# Altium footprint library Miscellaneous THD.PcbLib: 216 footprints (part 8 of 15)
Each footprint in its own frame and in the unit in brackets; x right, y up, seen from the top. Pads: shape width x height; smd on the part's side, far side on the other; paste and mask are expansions set on the pad; w line width, h text height; cw(c..) or ccw(c..) is an arc to the next point about the centre after c.
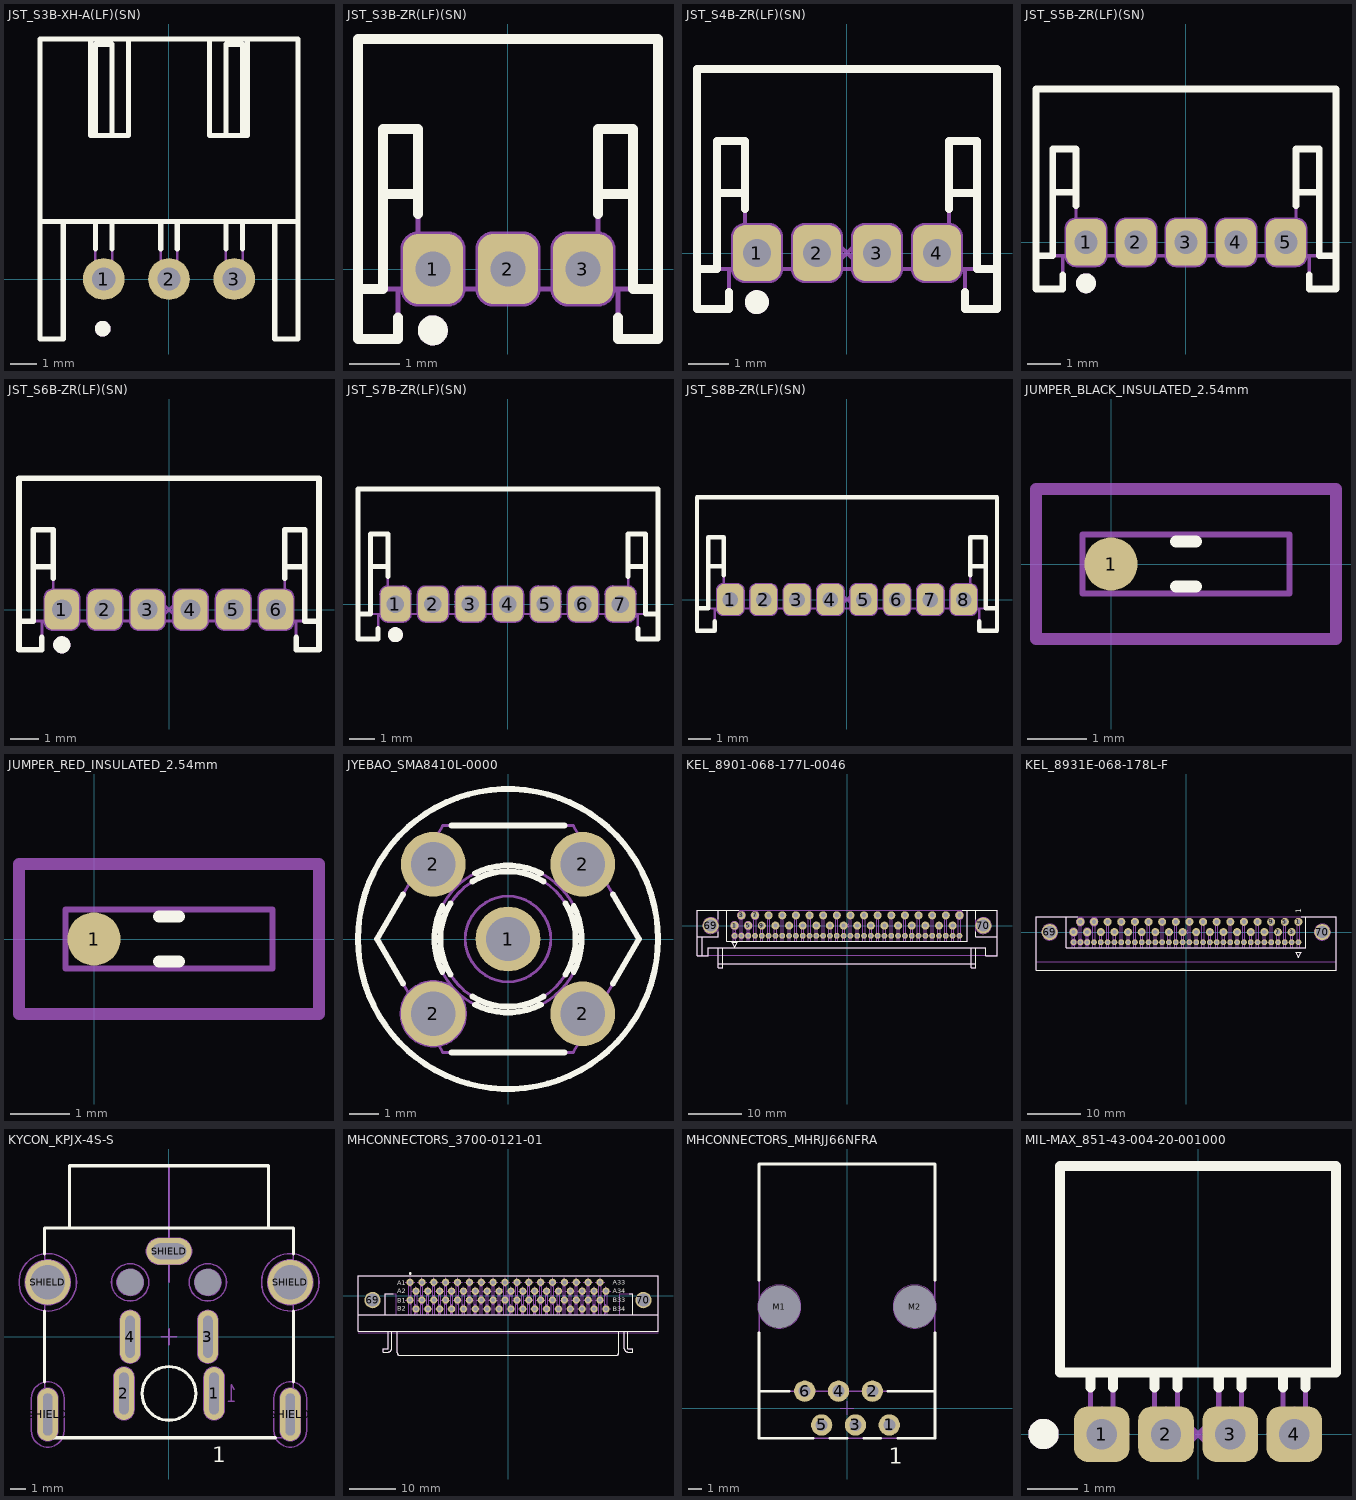
[diagram p7: the footprints below, top view; thin cyan lines are the x and y axes]

## JST_S3B-XH-A(LF)(SN) [mm] "2.5mm Pitch, 3 Contacts Right Angle Shrouded Header"
height 6.1
pads (3):
  round 1.6 hole 0.9: 1(-2.5,0) 2(0,0) 3(2.5,0)
Top Overlay:
  circle w0.3: c-2.54,-1.905 r0.15
  lines w0.2: -4.95,2.2 4.95,2.2 ; -4.05,2.2 -4.05,-2.3 -4.95,-2.3 -4.95,9.2 4.95,9.2 4.95,-2.3 4.05,-2.3 4.05,2.2 ; -3,9.2 -3,5.5 -1.55,5.5 -1.55,9.2 ; -2.82,1.157 -2.82,2.2 ; -2.82,5.5 -2.82,9 -2.18,9 -2.18,5.5 ; -2.18,1.157 -2.18,2.2 ; -0.32,1.157 -0.32,2.2 ; 0.32,1.157 0.32,2.2 ; 1.55,9.2 1.55,5.5 3,5.5 3,9.2 ; 2.18,1.157 2.18,2.2 ; 2.18,5.5 2.18,9 2.82,9 2.82,5.5 ; 2.82,1.157 2.82,2.2
Mechanical 8:
  lines w0.1: -3,0 -2.5,0 ; -2.5,-0.5 -2.5,0 ; -2.5,0.5 -2.5,0 ; -2,0 -2.5,0 ; -0.5,0 0,0 ; 0,-0.5 0,0 ; 0,0.5 0,0 ; 0.5,0 0,0 ; 2,0 2.5,0 ; 2.5,-0.5 2.5,0 ; 2.5,0.5 2.5,0 ; 3,0 2.5,0
Mechanical 14:
  circle w0.3: c-2.54,-1.905 r0.15
  lines w0.1: -4.95,2.2 4.95,2.2 ; -4.05,2.2 -4.05,-2.3 -4.95,-2.3 -4.95,9.2 4.95,9.2 4.95,-2.3 4.05,-2.3 4.05,2.2 ; -3,9.2 -3,5.5 -1.55,5.5 -1.55,9.2 ; -2.82,2.2 -2.82,-0.32 -2.18,-0.32 -2.18,2.2 ; -2.82,5.5 -2.82,9 -2.18,9 -2.18,5.5 ; -0.32,2.2 -0.32,-0.32 0.32,-0.32 0.32,2.2 ; 1.55,9.2 1.55,5.5 3,5.5 3,9.2 ; 2.18,2.2 2.18,-0.32 2.82,-0.32 2.82,2.2 ; 2.18,5.5 2.18,9 2.82,9 2.82,5.5
3D body "JST_S3B-XH-A(LF)(SN).stp": height 6.15, standoff -3.4, extent -4.95,-2.3 4.95,9.2

## JST_S3B-ZR(LF)(SN) [mm] "1.5mm Pitch, 3 Contacts Right Angle Shrouded Header"
height 3.7
pads (3):
  rrect50% 1.2x1.4 hole 0.7: 1(-1.5,0) 2(0,0) 3(1.5,0)
Top Overlay:
  circle w0.3: c-1.503,-1.228 r0.15
  lines w0.2: -3,-0.4 -2.5,-0.4 -2.5,2.8 -1.8,2.8 -1.8,1.1 ; -2.5,1.5 -1.8,1.5 ; -2.2,-0.974 -2.2,-1.4 -3,-1.4 -3,4.6 3,4.6 3,-1.4 2.2,-1.4 2.2,-0.974 ; 1.8,1.1 1.8,2.8 2.5,2.8 2.5,-0.4 3,-0.4 ; 1.8,1.5 2.5,1.5
Mechanical 8:
  circle w0.1: c0,0 r0.35
  circle w0.1: c1.5,0 r0.35
  circle w0.1: c-1.5,0 r0.35
  lines w0.1: -2,0 -1.5,0 ; -1.5,-0.5 -1.5,0 ; -1.5,0.5 -1.5,0 ; -1,0 -1.5,0 ; -0.5,0 0,0 ; -0.354,-0.354 0,0 ; -0.354,0.354 0,0 ; 0,-0.5 0,0 ; 0,0.5 0,0 ; 0.354,-0.354 0,0 ; 0.354,0.354 0,0 ; 0.5,0 0,0 ; 1,0 1.5,0 ; 1.5,-0.5 1.5,0 ; 1.5,0.5 1.5,0 ; 2,0 1.5,0 ; -2.1,-0.4 ccw(c-1.8,-0.4) -1.8,-0.7 -1.2,-0.7 ccw(c-1.2,-0.4) -0.9,-0.4 -0.9,0.4 ccw(c-1.2,0.4) -1.2,0.7 -1.8,0.7 ccw(c-1.8,0.4) -2.1,0.4 -2.1,-0.4 ; -2.1,-0.1 ccw(c-1.5,-0.1) -0.9,-0.1 -0.9,0.1 ccw(c-1.5,0.1) -2.1,0.1 -2.1,-0.1 ; -0.6,-0.4 ccw(c-0.3,-0.4) -0.3,-0.7 0.3,-0.7 ccw(c0.3,-0.4) 0.6,-0.4 0.6,0.4 ccw(c0.3,0.4) 0.3,0.7 -0.3,0.7 ccw(c-0.3,0.4) -0.6,0.4 -0.6,-0.4 ; -0.6,-0.1 ccw(c0,-0.1) 0.6,-0.1 0.6,0.1 ccw(c0,0.1) -0.6,0.1 -0.6,-0.1 ; 0.9,-0.4 ccw(c1.2,-0.4) 1.2,-0.7 1.8,-0.7 ccw(c1.8,-0.4) 2.1,-0.4 2.1,0.4 ccw(c1.8,0.4) 1.8,0.7 1.2,0.7 ccw(c1.2,0.4) 0.9,0.4 0.9,-0.4 ; 0.9,-0.1 ccw(c1.5,-0.1) 2.1,-0.1 2.1,0.1 ccw(c1.5,0.1) 0.9,0.1 0.9,-0.1
Mechanical 14:
  circle w0.3: c-1.503,-1.228 r0.15
  lines w0.1: -3,-0.4 3,-0.4 ; -2.5,-0.4 -2.5,2.8 -1.8,2.8 -1.8,-0.4 ; -2.5,1.5 -1.8,1.5 ; -2.2,-0.4 -2.2,-1.4 -3,-1.4 -3,4.6 3,4.6 3,-1.4 2.2,-1.4 2.2,-0.4 ; 1.8,-0.4 1.8,2.8 2.5,2.8 2.5,-0.4 ; 1.8,1.5 2.5,1.5
3D body "JST_S3B-ZR(LF)(SN).stp": height 3.7, standoff -2.7, extent -3,-1.4 3,4.6

## JST_S4B-ZR(LF)(SN) [mm] "1.5mm Pitch, 4 Contacts Right Angle Shrouded Header"
height 3.7
pads (4):
  rrect50% 1.2x1.4 hole 0.7: 1(-2.25,0) 2(-0.75,0) 3(0.75,0) 4(2.25,0)
Top Overlay:
  circle w0.3: c-2.253,-1.228 r0.15
  lines w0.2: -3.75,-0.4 -3.25,-0.4 -3.25,2.8 -2.55,2.8 -2.55,1.1 ; -3.25,1.5 -2.55,1.5 ; -2.95,-0.974 -2.95,-1.4 -3.75,-1.4 -3.75,4.6 3.75,4.6 3.75,-1.4 2.95,-1.4 2.95,-0.974 ; 2.55,1.1 2.55,2.8 3.25,2.8 3.25,-0.4 3.75,-0.4 ; 2.55,1.5 3.25,1.5
Mechanical 8:
  circle w0.1: c-2.25,0 r0.35
  circle w0.1: c0.75,0 r0.35
  circle w0.1: c-0.75,0 r0.35
  circle w0.1: c2.25,0 r0.35
  lines w0.1: -2.75,0 -2.25,0 ; -2.25,-0.5 -2.25,0 ; -2.25,0.5 -2.25,0 ; -1.75,0 -2.25,0 ; -1.25,0 -0.75,0 ; -0.75,-0.5 -0.75,0 ; -0.75,0.5 -0.75,0 ; -0.354,-0.354 0,0 ; -0.354,0.354 0,0 ; -0.25,0 -0.75,0 ; 0.25,0 0.75,0 ; 0.354,-0.354 0,0 ; 0.354,0.354 0,0 ; 0.75,-0.5 0.75,0 ; 0.75,0.5 0.75,0 ; 1.25,0 0.75,0 ; 1.75,0 2.25,0 ; 2.25,-0.5 2.25,0 ; 2.25,0.5 2.25,0 ; 2.75,0 2.25,0 ; -2.85,-0.4 ccw(c-2.55,-0.4) -2.55,-0.7 -1.95,-0.7 ccw(c-1.95,-0.4) -1.65,-0.4 -1.65,0.4 ccw(c-1.95,0.4) -1.95,0.7 -2.55,0.7 ccw(c-2.55,0.4) -2.85,0.4 -2.85,-0.4 ; -2.85,-0.1 ccw(c-2.25,-0.1) -1.65,-0.1 -1.65,0.1 ccw(c-2.25,0.1) -2.85,0.1 -2.85,-0.1 ; -1.35,-0.4 ccw(c-1.05,-0.4) -1.05,-0.7 -0.45,-0.7 ccw(c-0.45,-0.4) -0.15,-0.4 -0.15,0.4 ccw(c-0.45,0.4) -0.45,0.7 -1.05,0.7 ccw(c-1.05,0.4) -1.35,0.4 -1.35,-0.4 ; -1.35,-0.1 ccw(c-0.75,-0.1) -0.15,-0.1 -0.15,0.1 ccw(c-0.75,0.1) -1.35,0.1 -1.35,-0.1 ; 0.15,-0.4 ccw(c0.45,-0.4) 0.45,-0.7 1.05,-0.7 ccw(c1.05,-0.4) 1.35,-0.4 1.35,0.4 ccw(c1.05,0.4) 1.05,0.7 0.45,0.7 ccw(c0.45,0.4) 0.15,0.4 0.15,-0.4 ; 0.15,-0.1 ccw(c0.75,-0.1) 1.35,-0.1 1.35,0.1 ccw(c0.75,0.1) 0.15,0.1 0.15,-0.1 ; 1.65,-0.4 ccw(c1.95,-0.4) 1.95,-0.7 2.55,-0.7 ccw(c2.55,-0.4) 2.85,-0.4 2.85,0.4 ccw(c2.55,0.4) 2.55,0.7 1.95,0.7 ccw(c1.95,0.4) 1.65,0.4 1.65,-0.4 ; 1.65,-0.1 ccw(c2.25,-0.1) 2.85,-0.1 2.85,0.1 ccw(c2.25,0.1) 1.65,0.1 1.65,-0.1
Mechanical 14:
  circle w0.3: c-2.253,-1.228 r0.15
  lines w0.1: -3.75,-0.4 3.75,-0.4 ; -3.25,-0.4 -3.25,2.8 -2.55,2.8 -2.55,-0.4 ; -3.25,1.5 -2.55,1.5 ; -2.95,-0.4 -2.95,-1.4 -3.75,-1.4 -3.75,4.6 3.75,4.6 3.75,-1.4 2.95,-1.4 2.95,-0.4 ; 2.55,-0.4 2.55,2.8 3.25,2.8 3.25,-0.4 ; 2.55,1.5 3.25,1.5
3D body "JST_S4B-ZR(LF)(SN).stp": height 3.7, standoff -2.7, extent -3.75,-1.4 3.75,4.6

## JST_S5B-ZR(LF)(SN) [mm] "1.5mm Pitch, 5 Contacts Right Angle Shrouded Header"
height 3.7
pads (5):
  rrect50% 1.2x1.4 hole 0.7: 1(-3,0) 2(-1.5,0) 3(0,0) 4(1.5,0) 5(3,0)
Top Overlay:
  circle w0.3: c-3.003,-1.228 r0.15
  lines w0.2: -4.5,-0.4 -4,-0.4 -4,2.8 -3.3,2.8 -3.3,1.1 ; -4,1.5 -3.3,1.5 ; -3.7,-0.974 -3.7,-1.4 -4.5,-1.4 -4.5,4.6 4.5,4.6 4.5,-1.4 3.7,-1.4 3.7,-0.974 ; 3.3,1.1 3.3,2.8 4,2.8 4,-0.4 4.5,-0.4 ; 3.3,1.5 4,1.5
Mechanical 8:
  circle w0.1: c-3,0 r0.35
  circle w0.1: c1.5,0 r0.35
  circle w0.1: c-1.5,0 r0.35
  circle w0.1: c3,0 r0.35
  circle w0.1: c0,0 r0.35
  lines w0.1: -3.5,0 -3,0 ; -3,-0.5 -3,0 ; -3,0.5 -3,0 ; -2.5,0 -3,0 ; -2,0 -1.5,0 ; -1.5,-0.5 -1.5,0 ; -1.5,0.5 -1.5,0 ; -1,0 -1.5,0 ; -0.5,0 0,0 ; -0.354,-0.354 0,0 ; -0.354,0.354 0,0 ; 0,-0.5 0,0 ; 0,0.5 0,0 ; 0.354,-0.354 0,0 ; 0.354,0.354 0,0 ; 0.5,0 0,0 ; 1,0 1.5,0 ; 1.5,-0.5 1.5,0 ; 1.5,0.5 1.5,0 ; 2,0 1.5,0 ; 2.5,0 3,0 ; 3,-0.5 3,0 ; 3,0.5 3,0 ; 3.5,0 3,0 ; -3.6,-0.4 ccw(c-3.3,-0.4) -3.3,-0.7 -2.7,-0.7 ccw(c-2.7,-0.4) -2.4,-0.4 -2.4,0.4 ccw(c-2.7,0.4) -2.7,0.7 -3.3,0.7 ccw(c-3.3,0.4) -3.6,0.4 -3.6,-0.4 ; -3.6,-0.1 ccw(c-3,-0.1) -2.4,-0.1 -2.4,0.1 ccw(c-3,0.1) -3.6,0.1 -3.6,-0.1 ; -2.1,-0.4 ccw(c-1.8,-0.4) -1.8,-0.7 -1.2,-0.7 ccw(c-1.2,-0.4) -0.9,-0.4 -0.9,0.4 ccw(c-1.2,0.4) -1.2,0.7 -1.8,0.7 ccw(c-1.8,0.4) -2.1,0.4 -2.1,-0.4 ; -2.1,-0.1 ccw(c-1.5,-0.1) -0.9,-0.1 -0.9,0.1 ccw(c-1.5,0.1) -2.1,0.1 -2.1,-0.1 ; -0.6,-0.4 ccw(c-0.3,-0.4) -0.3,-0.7 0.3,-0.7 ccw(c0.3,-0.4) 0.6,-0.4 0.6,0.4 ccw(c0.3,0.4) 0.3,0.7 -0.3,0.7 ccw(c-0.3,0.4) -0.6,0.4 -0.6,-0.4 ; -0.6,-0.1 ccw(c0,-0.1) 0.6,-0.1 0.6,0.1 ccw(c0,0.1) -0.6,0.1 -0.6,-0.1 ; 0.9,-0.4 ccw(c1.2,-0.4) 1.2,-0.7 1.8,-0.7 ccw(c1.8,-0.4) 2.1,-0.4 2.1,0.4 ccw(c1.8,0.4) 1.8,0.7 1.2,0.7 ccw(c1.2,0.4) 0.9,0.4 0.9,-0.4 ; 0.9,-0.1 ccw(c1.5,-0.1) 2.1,-0.1 2.1,0.1 ccw(c1.5,0.1) 0.9,0.1 0.9,-0.1 ; 2.4,-0.4 ccw(c2.7,-0.4) 2.7,-0.7 3.3,-0.7 ccw(c3.3,-0.4) 3.6,-0.4 3.6,0.4 ccw(c3.3,0.4) 3.3,0.7 2.7,0.7 ccw(c2.7,0.4) 2.4,0.4 2.4,-0.4 ; 2.4,-0.1 ccw(c3,-0.1) 3.6,-0.1 3.6,0.1 ccw(c3,0.1) 2.4,0.1 2.4,-0.1
Mechanical 14:
  circle w0.3: c-3.003,-1.228 r0.15
  lines w0.1: -4.5,-0.4 4.5,-0.4 ; -4,-0.4 -4,2.8 -3.3,2.8 -3.3,-0.4 ; -4,1.5 -3.3,1.5 ; -3.7,-0.4 -3.7,-1.4 -4.5,-1.4 -4.5,4.6 4.5,4.6 4.5,-1.4 3.7,-1.4 3.7,-0.4 ; 3.3,-0.4 3.3,2.8 4,2.8 4,-0.4 ; 3.3,1.5 4,1.5
3D body "JST_S5B-ZR(LF)(SN).stp": height 3.7, standoff -2.7, extent -4.5,-1.4 4.5,4.6

## JST_S6B-ZR(LF)(SN) [mm] "1.5mm Pitch, 6 Contacts Right Angle Shrouded Header"
height 3.7
pads (6):
  rrect50% 1.2x1.4 hole 0.7: 1(-3.75,0) 2(-2.25,0) 3(-0.75,0) 4(0.75,0) 5(2.25,0) 6(3.75,0)
Top Overlay:
  circle w0.3: c-3.753,-1.228 r0.15
  lines w0.2: -5.25,-0.4 -4.75,-0.4 -4.75,2.8 -4.05,2.8 -4.05,1.1 ; -4.75,1.5 -4.05,1.5 ; -4.45,-0.974 -4.45,-1.4 -5.25,-1.4 -5.25,4.6 5.25,4.6 5.25,-1.4 4.45,-1.4 4.45,-0.974 ; 4.05,1.1 4.05,2.8 4.75,2.8 4.75,-0.4 5.25,-0.4 ; 4.05,1.5 4.75,1.5
Mechanical 8:
  circle w0.1: c-3.75,0 r0.35
  circle w0.1: c0.75,0 r0.35
  circle w0.1: c-0.75,0 r0.35
  circle w0.1: c3.75,0 r0.35
  circle w0.1: c2.25,0 r0.35
  circle w0.1: c-2.25,0 r0.35
  lines w0.1: -4.25,0 -3.75,0 ; -3.75,-0.5 -3.75,0 ; -3.75,0.5 -3.75,0 ; -3.25,0 -3.75,0 ; -2.75,0 -2.25,0 ; -2.25,-0.5 -2.25,0 ; -2.25,0.5 -2.25,0 ; -1.75,0 -2.25,0 ; -1.25,0 -0.75,0 ; -0.75,-0.5 -0.75,0 ; -0.75,0.5 -0.75,0 ; -0.354,-0.354 0,0 ; -0.354,0.354 0,0 ; -0.25,0 -0.75,0 ; 0.25,0 0.75,0 ; 0.354,-0.354 0,0 ; 0.354,0.354 0,0 ; 0.75,-0.5 0.75,0 ; 0.75,0.5 0.75,0 ; 1.25,0 0.75,0 ; 1.75,0 2.25,0 ; 2.25,-0.5 2.25,0 ; 2.25,0.5 2.25,0 ; 2.75,0 2.25,0 ; 3.25,0 3.75,0 ; 3.75,-0.5 3.75,0 ; 3.75,0.5 3.75,0 ; 4.25,0 3.75,0 ; -4.35,-0.4 ccw(c-4.05,-0.4) -4.05,-0.7 -3.45,-0.7 ccw(c-3.45,-0.4) -3.15,-0.4 -3.15,0.4 ccw(c-3.45,0.4) -3.45,0.7 -4.05,0.7 ccw(c-4.05,0.4) -4.35,0.4 -4.35,-0.4 ; -4.35,-0.1 ccw(c-3.75,-0.1) -3.15,-0.1 -3.15,0.1 ccw(c-3.75,0.1) -4.35,0.1 -4.35,-0.1 ; -2.85,-0.4 ccw(c-2.55,-0.4) -2.55,-0.7 -1.95,-0.7 ccw(c-1.95,-0.4) -1.65,-0.4 -1.65,0.4 ccw(c-1.95,0.4) -1.95,0.7 -2.55,0.7 ccw(c-2.55,0.4) -2.85,0.4 -2.85,-0.4 ; -2.85,-0.1 ccw(c-2.25,-0.1) -1.65,-0.1 -1.65,0.1 ccw(c-2.25,0.1) -2.85,0.1 -2.85,-0.1 ; -1.35,-0.4 ccw(c-1.05,-0.4) -1.05,-0.7 -0.45,-0.7 ccw(c-0.45,-0.4) -0.15,-0.4 -0.15,0.4 ccw(c-0.45,0.4) -0.45,0.7 -1.05,0.7 ccw(c-1.05,0.4) -1.35,0.4 -1.35,-0.4 ; -1.35,-0.1 ccw(c-0.75,-0.1) -0.15,-0.1 -0.15,0.1 ccw(c-0.75,0.1) -1.35,0.1 -1.35,-0.1 ; 0.15,-0.4 ccw(c0.45,-0.4) 0.45,-0.7 1.05,-0.7 ccw(c1.05,-0.4) 1.35,-0.4 1.35,0.4 ccw(c1.05,0.4) 1.05,0.7 0.45,0.7 ccw(c0.45,0.4) 0.15,0.4 0.15,-0.4 ; 0.15,-0.1 ccw(c0.75,-0.1) 1.35,-0.1 1.35,0.1 ccw(c0.75,0.1) 0.15,0.1 0.15,-0.1 ; 1.65,-0.4 ccw(c1.95,-0.4) 1.95,-0.7 2.55,-0.7 ccw(c2.55,-0.4) 2.85,-0.4 2.85,0.4 ccw(c2.55,0.4) 2.55,0.7 1.95,0.7 ccw(c1.95,0.4) 1.65,0.4 1.65,-0.4 ; 1.65,-0.1 ccw(c2.25,-0.1) 2.85,-0.1 2.85,0.1 ccw(c2.25,0.1) 1.65,0.1 1.65,-0.1 ; 3.15,-0.4 ccw(c3.45,-0.4) 3.45,-0.7 4.05,-0.7 ccw(c4.05,-0.4) 4.35,-0.4 4.35,0.4 ccw(c4.05,0.4) 4.05,0.7 3.45,0.7 ccw(c3.45,0.4) 3.15,0.4 3.15,-0.4 ; 3.15,-0.1 ccw(c3.75,-0.1) 4.35,-0.1 4.35,0.1 ccw(c3.75,0.1) 3.15,0.1 3.15,-0.1
Mechanical 14:
  circle w0.3: c-3.753,-1.228 r0.15
  lines w0.1: -5.25,-0.4 5.25,-0.4 ; -4.75,-0.4 -4.75,2.8 -4.05,2.8 -4.05,-0.4 ; -4.75,1.5 -4.05,1.5 ; -4.45,-0.4 -4.45,-1.4 -5.25,-1.4 -5.25,4.6 5.25,4.6 5.25,-1.4 4.45,-1.4 4.45,-0.4 ; 4.05,-0.4 4.05,2.8 4.75,2.8 4.75,-0.4 ; 4.05,1.5 4.75,1.5
3D body "JST_S6B-ZR(LF)(SN).stp": height 3.7, standoff -2.7, extent -5.25,-1.4 5.25,4.6

## JST_S7B-ZR(LF)(SN) [mm] "1.5mm Pitch, 7 Contacts Right Angle Shrouded Header"
height 3.7
pads (7):
  rrect50% 1.2x1.4 hole 0.7: 1(-4.5,0) 2(-3,0) 3(-1.5,0) 4(0,0) 5(1.5,0) 6(3,0) 7(4.5,0)
Top Overlay:
  circle w0.3: c-4.503,-1.228 r0.15
  lines w0.2: -6,-0.4 -5.5,-0.4 -5.5,2.8 -4.8,2.8 -4.8,1.1 ; -5.5,1.5 -4.8,1.5 ; -5.2,-0.974 -5.2,-1.4 -6,-1.4 -6,4.6 6,4.6 6,-1.4 5.2,-1.4 5.2,-0.974 ; 4.8,1.1 4.8,2.8 5.5,2.8 5.5,-0.4 6,-0.4 ; 4.8,1.5 5.5,1.5
Mechanical 8:
  circle w0.1: c-4.5,0 r0.35
  circle w0.1: c1.5,0 r0.35
  circle w0.1: c-1.5,0 r0.35
  circle w0.1: c4.5,0 r0.35
  circle w0.1: c3,0 r0.35
  circle w0.1: c-3,0 r0.35
  circle w0.1: c0,0 r0.35
  lines w0.1: -5,0 -4.5,0 ; -4.5,-0.5 -4.5,0 ; -4.5,0.5 -4.5,0 ; -4,0 -4.5,0 ; -3.5,0 -3,0 ; -3,-0.5 -3,0 ; -3,0.5 -3,0 ; -2.5,0 -3,0 ; -2,0 -1.5,0 ; -1.5,-0.5 -1.5,0 ; -1.5,0.5 -1.5,0 ; -1,0 -1.5,0 ; -0.5,0 0,0 ; -0.353,-0.354 0,0 ; -0.353,0.354 0,0 ; 0,-0.5 0,0 ; 0,0.5 0,0 ; 0.354,-0.354 0,0 ; 0.354,0.354 0,0 ; 0.5,0 0,0 ; 1,0 1.5,0 ; 1.5,-0.5 1.5,0 ; 1.5,0.5 1.5,0 ; 2,0 1.5,0 ; 2.5,0 3,0 ; 3,-0.5 3,0 ; 3,0.5 3,0 ; 3.5,0 3,0 ; 4,0 4.5,0 ; 4.5,-0.5 4.5,0 ; 4.5,0.5 4.5,0 ; 5,0 4.5,0 ; -5.1,-0.4 ccw(c-4.8,-0.4) -4.8,-0.7 -4.2,-0.7 ccw(c-4.2,-0.4) -3.9,-0.4 -3.9,0.4 ccw(c-4.2,0.4) -4.2,0.7 -4.8,0.7 ccw(c-4.8,0.4) -5.1,0.4 -5.1,-0.4 ; -5.1,-0.1 ccw(c-4.5,-0.1) -3.9,-0.1 -3.9,0.1 ccw(c-4.5,0.1) -5.1,0.1 -5.1,-0.1 ; -3.6,-0.4 ccw(c-3.3,-0.4) -3.3,-0.7 -2.7,-0.7 ccw(c-2.7,-0.4) -2.4,-0.4 -2.4,0.4 ccw(c-2.7,0.4) -2.7,0.7 -3.3,0.7 ccw(c-3.3,0.4) -3.6,0.4 -3.6,-0.4 ; -3.6,-0.1 ccw(c-3,-0.1) -2.4,-0.1 -2.4,0.1 ccw(c-3,0.1) -3.6,0.1 -3.6,-0.1 ; -2.1,-0.4 ccw(c-1.8,-0.4) -1.8,-0.7 -1.2,-0.7 ccw(c-1.2,-0.4) -0.9,-0.4 -0.9,0.4 ccw(c-1.2,0.4) -1.2,0.7 -1.8,0.7 ccw(c-1.8,0.4) -2.1,0.4 -2.1,-0.4 ; -2.1,-0.1 ccw(c-1.5,-0.1) -0.9,-0.1 -0.9,0.1 ccw(c-1.5,0.1) -2.1,0.1 -2.1,-0.1 ; -0.6,-0.4 ccw(c-0.3,-0.4) -0.3,-0.7 0.3,-0.7 ccw(c0.3,-0.4) 0.6,-0.4 0.6,0.4 ccw(c0.3,0.4) 0.3,0.7 -0.3,0.7 ccw(c-0.3,0.4) -0.6,0.4 -0.6,-0.4 ; -0.6,-0.1 ccw(c0,-0.1) 0.6,-0.1 0.6,0.1 ccw(c0,0.1) -0.6,0.1 -0.6,-0.1 ; 0.9,-0.4 ccw(c1.2,-0.4) 1.2,-0.7 1.8,-0.7 ccw(c1.8,-0.4) 2.1,-0.4 2.1,0.4 ccw(c1.8,0.4) 1.8,0.7 1.2,0.7 ccw(c1.2,0.4) 0.9,0.4 0.9,-0.4 ; 0.9,-0.1 ccw(c1.5,-0.1) 2.1,-0.1 2.1,0.1 ccw(c1.5,0.1) 0.9,0.1 0.9,-0.1 ; 2.4,-0.4 ccw(c2.7,-0.4) 2.7,-0.7 3.3,-0.7 ccw(c3.3,-0.4) 3.6,-0.4 3.6,0.4 ccw(c3.3,0.4) 3.3,0.7 2.7,0.7 ccw(c2.7,0.4) 2.4,0.4 2.4,-0.4 ; 2.4,-0.1 ccw(c3,-0.1) 3.6,-0.1 3.6,0.1 ccw(c3,0.1) 2.4,0.1 2.4,-0.1 ; 3.9,-0.4 ccw(c4.2,-0.4) 4.2,-0.7 4.8,-0.7 ccw(c4.8,-0.4) 5.1,-0.4 5.1,0.4 ccw(c4.8,0.4) 4.8,0.7 4.2,0.7 ccw(c4.2,0.4) 3.9,0.4 3.9,-0.4 ; 3.9,-0.1 ccw(c4.5,-0.1) 5.1,-0.1 5.1,0.1 ccw(c4.5,0.1) 3.9,0.1 3.9,-0.1
Mechanical 14:
  circle w0.3: c-4.503,-1.228 r0.15
  lines w0.1: -6,-0.4 6,-0.4 ; -5.5,-0.4 -5.5,2.8 -4.8,2.8 -4.8,-0.4 ; -5.5,1.5 -4.8,1.5 ; -5.2,-0.4 -5.2,-1.4 -6,-1.4 -6,4.6 6,4.6 6,-1.4 5.2,-1.4 5.2,-0.4 ; 4.8,-0.4 4.8,2.8 5.5,2.8 5.5,-0.4 ; 4.8,1.5 5.5,1.5
3D body "JST_S7B-ZR(LF)(SN).stp": height 3.7, standoff -2.7, extent -6,-1.4 6,4.6

## JST_S8B-ZR(LF)(SN) [mm] "1.5mm Pitch, 8 Contacts Right Angle Shrouded Header"
height 3.7
pads (8):
  rrect50% 1.2x1.4 hole 0.7: 1(-5.25,0) 2(-3.75,0) 3(-2.25,0) 4(-0.75,0) 5(0.75,0) 6(2.25,0) 7(3.75,0) 8(5.25,0)
Top Overlay:
  lines w0.2: -6.75,-0.4 -6.25,-0.4 -6.25,2.8 -5.55,2.8 -5.55,1.1 ; -6.25,1.5 -5.55,1.5 ; -5.95,-0.974 -5.95,-1.4 -6.75,-1.4 -6.75,4.6 6.75,4.6 6.75,-1.4 5.95,-1.4 5.95,-0.974 ; 5.55,1.1 5.55,2.8 6.25,2.8 6.25,-0.4 6.75,-0.4 ; 5.55,1.5 6.25,1.5
Mechanical 8:
  circle w0.1: c-5.25,0 r0.35
  circle w0.1: c2.25,0 r0.35
  circle w0.1: c-2.25,0 r0.35
  circle w0.1: c5.25,0 r0.35
  circle w0.1: c3.75,0 r0.35
  circle w0.1: c-3.75,0 r0.35
  circle w0.1: c-0.75,0 r0.35
  circle w0.1: c0.75,0 r0.35
  lines w0.1: -5.75,0 -5.25,0 ; -5.25,-0.5 -5.25,0 ; -5.25,0.5 -5.25,0 ; -4.75,0 -5.25,0 ; -4.25,0 -3.75,0 ; -3.75,-0.5 -3.75,0 ; -3.75,0.5 -3.75,0 ; -3.25,0 -3.75,0 ; -2.75,0 -2.25,0 ; -2.25,-0.5 -2.25,0 ; -2.25,0.5 -2.25,0 ; -1.75,0 -2.25,0 ; -1.25,0 -0.75,0 ; -0.75,-0.5 -0.75,0 ; -0.75,0.5 -0.75,0 ; -0.354,-0.354 0,0 ; -0.354,0.354 0,0 ; -0.25,0 -0.75,0 ; 0.25,0 0.75,0 ; 0.354,-0.354 0,0 ; 0.354,0.354 0,0 ; 0.75,-0.5 0.75,0 ; 0.75,0.5 0.75,0 ; 1.25,0 0.75,0 ; 1.75,0 2.25,0 ; 2.25,-0.5 2.25,0 ; 2.25,0.5 2.25,0 ; 2.75,0 2.25,0 ; 3.25,0 3.75,0 ; 3.75,-0.5 3.75,0 ; 3.75,0.5 3.75,0 ; 4.25,0 3.75,0 ; 4.75,0 5.25,0 ; 5.25,-0.5 5.25,0 ; 5.25,0.5 5.25,0 ; 5.75,0 5.25,0 ; -5.85,-0.4 ccw(c-5.55,-0.4) -5.55,-0.7 -4.95,-0.7 ccw(c-4.95,-0.4) -4.65,-0.4 -4.65,0.4 ccw(c-4.95,0.4) -4.95,0.7 -5.55,0.7 ccw(c-5.55,0.4) -5.85,0.4 -5.85,-0.4 ; -5.85,-0.1 ccw(c-5.25,-0.1) -4.65,-0.1 -4.65,0.1 ccw(c-5.25,0.1) -5.85,0.1 -5.85,-0.1 ; -4.35,-0.4 ccw(c-4.05,-0.4) -4.05,-0.7 -3.45,-0.7 ccw(c-3.45,-0.4) -3.15,-0.4 -3.15,0.4 ccw(c-3.45,0.4) -3.45,0.7 -4.05,0.7 ccw(c-4.05,0.4) -4.35,0.4 -4.35,-0.4 ; -4.35,-0.1 ccw(c-3.75,-0.1) -3.15,-0.1 -3.15,0.1 ccw(c-3.75,0.1) -4.35,0.1 -4.35,-0.1 ; -2.85,-0.4 ccw(c-2.55,-0.4) -2.55,-0.7 -1.95,-0.7 ccw(c-1.95,-0.4) -1.65,-0.4 -1.65,0.4 ccw(c-1.95,0.4) -1.95,0.7 -2.55,0.7 ccw(c-2.55,0.4) -2.85,0.4 -2.85,-0.4 ; -2.85,-0.1 ccw(c-2.25,-0.1) -1.65,-0.1 -1.65,0.1 ccw(c-2.25,0.1) -2.85,0.1 -2.85,-0.1 ; -1.35,-0.4 ccw(c-1.05,-0.4) -1.05,-0.7 -0.45,-0.7 ccw(c-0.45,-0.4) -0.15,-0.4 -0.15,0.4 ccw(c-0.45,0.4) -0.45,0.7 -1.05,0.7 ccw(c-1.05,0.4) -1.35,0.4 -1.35,-0.4 ; -1.35,-0.1 ccw(c-0.75,-0.1) -0.15,-0.1 -0.15,0.1 ccw(c-0.75,0.1) -1.35,0.1 -1.35,-0.1 ; 0.15,-0.4 ccw(c0.45,-0.4) 0.45,-0.7 1.05,-0.7 ccw(c1.05,-0.4) 1.35,-0.4 1.35,0.4 ccw(c1.05,0.4) 1.05,0.7 0.45,0.7 ccw(c0.45,0.4) 0.15,0.4 0.15,-0.4 ; 0.15,-0.1 ccw(c0.75,-0.1) 1.35,-0.1 1.35,0.1 ccw(c0.75,0.1) 0.15,0.1 0.15,-0.1 ; 1.65,-0.4 ccw(c1.95,-0.4) 1.95,-0.7 2.55,-0.7 ccw(c2.55,-0.4) 2.85,-0.4 2.85,0.4 ccw(c2.55,0.4) 2.55,0.7 1.95,0.7 ccw(c1.95,0.4) 1.65,0.4 1.65,-0.4 ; 1.65,-0.1 ccw(c2.25,-0.1) 2.85,-0.1 2.85,0.1 ccw(c2.25,0.1) 1.65,0.1 1.65,-0.1 ; 3.15,-0.4 ccw(c3.45,-0.4) 3.45,-0.7 4.05,-0.7 ccw(c4.05,-0.4) 4.35,-0.4 4.35,0.4 ccw(c4.05,0.4) 4.05,0.7 3.45,0.7 ccw(c3.45,0.4) 3.15,0.4 3.15,-0.4 ; 3.15,-0.1 ccw(c3.75,-0.1) 4.35,-0.1 4.35,0.1 ccw(c3.75,0.1) 3.15,0.1 3.15,-0.1 ; 4.65,-0.4 ccw(c4.95,-0.4) 4.95,-0.7 5.55,-0.7 ccw(c5.55,-0.4) 5.85,-0.4 5.85,0.4 ccw(c5.55,0.4) 5.55,0.7 4.95,0.7 ccw(c4.95,0.4) 4.65,0.4 4.65,-0.4 ; 4.65,-0.1 ccw(c5.25,-0.1) 5.85,-0.1 5.85,0.1 ccw(c5.25,0.1) 4.65,0.1 4.65,-0.1
Mechanical 14:
  lines w0.1: -6.75,-0.4 6.75,-0.4 ; -6.25,-0.4 -6.25,2.8 -5.55,2.8 -5.55,-0.4 ; -6.25,1.5 -5.55,1.5 ; -5.95,-0.4 -5.95,-1.4 -6.75,-1.4 -6.75,4.6 6.75,4.6 6.75,-1.4 5.95,-1.4 5.95,-0.4 ; 5.55,-0.4 5.55,2.8 6.25,2.8 6.25,-0.4 ; 5.55,1.5 6.25,1.5
3D body "JST_S8B-ZR(LF)(SN).stp": height 3.7, standoff -2.7, extent -6.75,-1.4 6.75,4.6

## JUMPER_BLACK_INSULATED_2.54mm [mm] "Black Insulated Jumper Pitch 2.54mm W=2.5mm L=5mm H=6.5mm"
height 6.5
pads (1):
  round 0.9 smd paste-0.46 mask-0.46: 1(0,0)
Top Overlay:
  lines w0.2: 1.1,-0.381 1.44,-0.381 ; 1.1,0.381 1.44,0.381
Mechanical 13:
  lines w0.2: -1.27,-1.27 3.81,-1.27 3.81,1.27 -1.27,1.27 -1.27,-1.27
Mechanical 14:
  lines w0.1: -0.48,-0.5 3.02,-0.5 3.02,0.5 -0.48,0.5 -0.48,-0.5
3D body "JUMPER_BLACK_INSULATED_2.54MM.stp": height 8.2, standoff 1.7, extent -1.269,-1.269 3.731,1.231

## JUMPER_RED_INSULATED_2.54mm [mm] "Red Insulated Jumper Pitch 2.54mm W=2.5mm L=5mm H=6.5mm"
height 6.5
pads (1):
  round 0.9 smd paste-0.46 mask-0.46: 1(0,0)
Top Overlay:
  lines w0.2: 1.1,-0.381 1.44,-0.381 ; 1.1,0.381 1.44,0.381
Mechanical 13:
  lines w0.2: -1.27,-1.27 3.81,-1.27 3.81,1.27 -1.27,1.27 -1.27,-1.27
Mechanical 14:
  lines w0.1: -0.48,-0.5 3.02,-0.5 3.02,0.5 -0.48,0.5 -0.48,-0.5
3D body "JUMPER_RED_INSULATED_2.54MM.stp": height 8.2, standoff 1.7, extent -1.269,-1.269 3.731,1.231
